# Altium footprint library THU VIEN PCB.PCBLib: 911 footprints (part 56 of 57)
Each footprint in its own frame and in the unit in brackets; x right, y up, seen from the top. Pads: shape width x height; smd on the part's side, far side on the other; paste and mask are expansions set on the pad; w line width, h text height; cw(c..) or ccw(c..) is an arc to the next point about the centre after c.
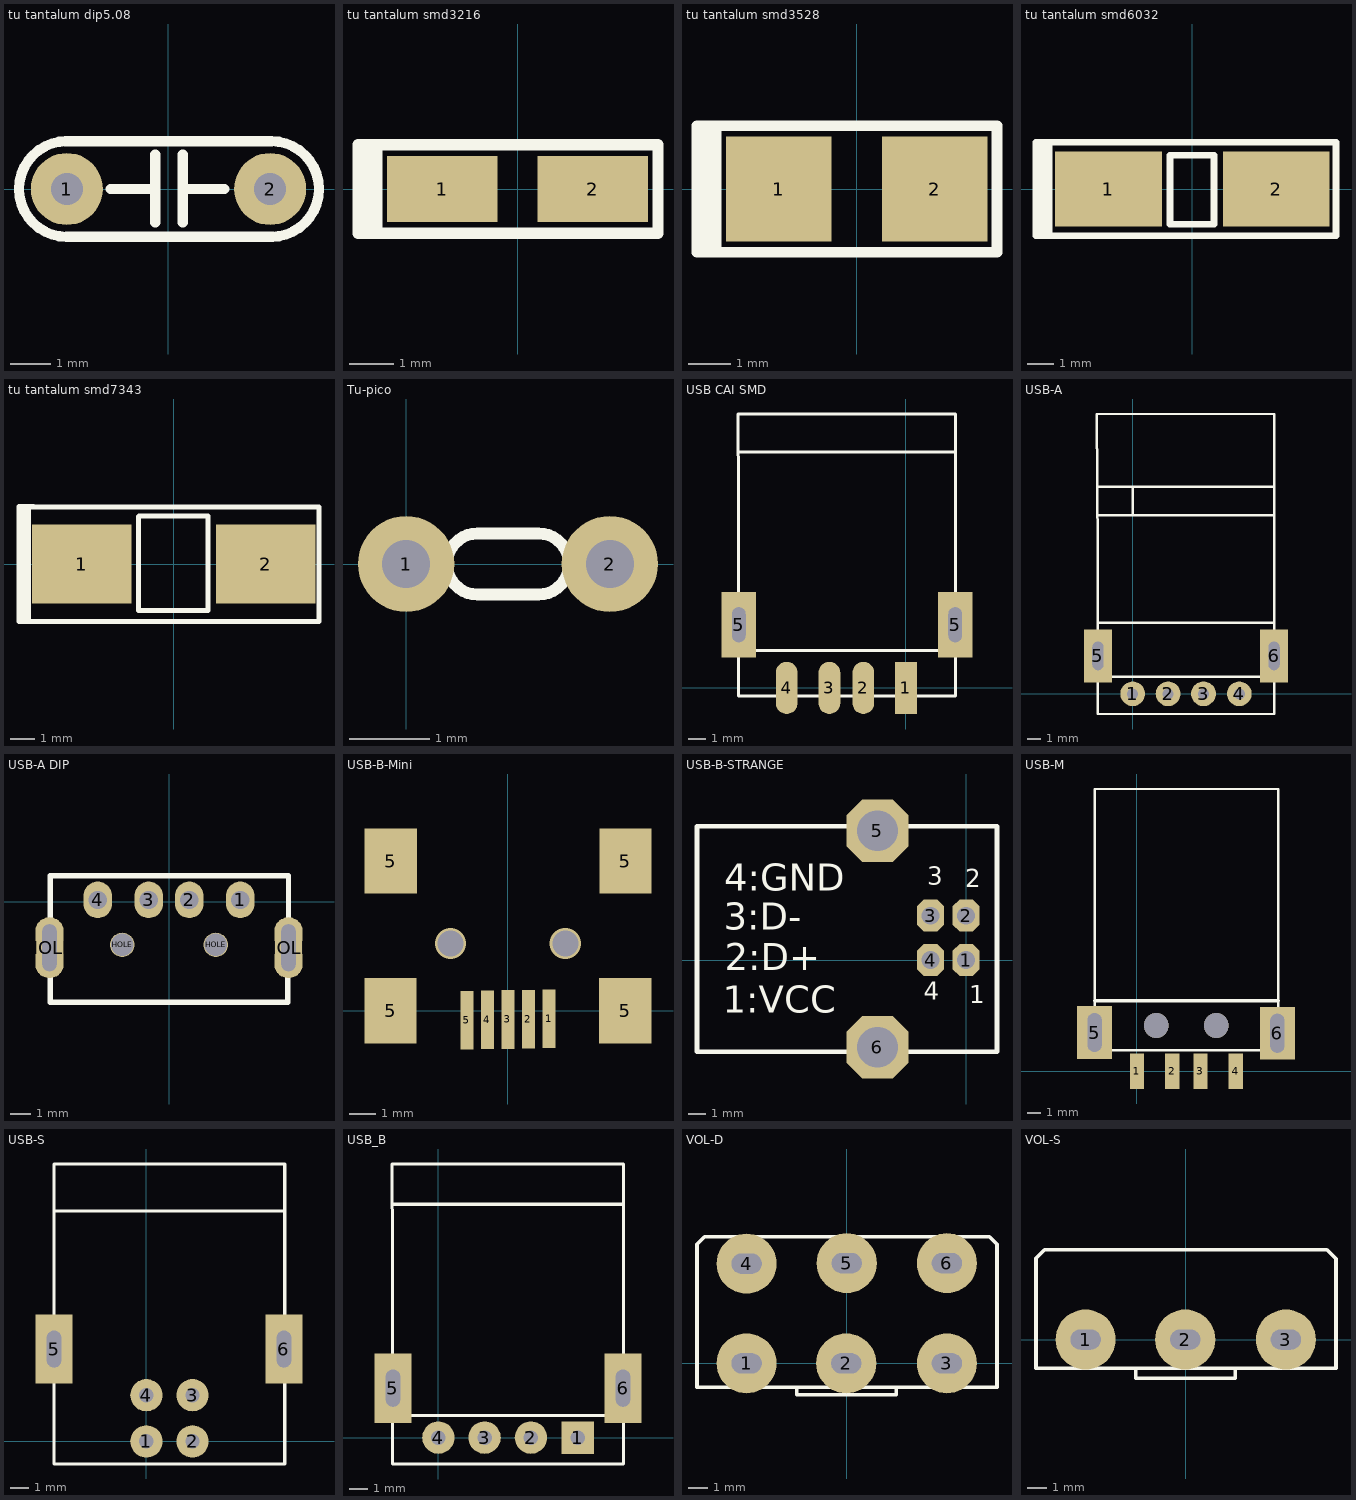
[diagram p55: the footprints below, top view; thin cyan lines are the x and y axes]

## tu tantalum dip5.08 [mm]
pads (2):
  round 1.8 hole 0.8: 1(-2.54,0) 2(2.54,0)
Top Overlay:
  lines w0.254: -2.565,1.194 2.565,1.194 ; -2.541,-1.195 cw(c-2.54,0) -2.541,1.195 ; -2.489,-1.194 2.591,-1.194 ; -1.448,0 -0.406,0 ; -0.33,-0.838 -0.33,0.864 ; 0.356,-0.838 0.356,0.864 ; 0.356,0 1.397,0 ; 2.566,-1.195 ccw(c2.565,0) 2.566,1.195
3D body "TU_TATA_5.08.step": height 6.27, standoff -0.47, extent -2.819,-1.079 2.769,1.08

## tu tantalum smd3216 [mm]
pads (2):
  rect 2.5x1.5 smd: 1(-1.7,0) 2(1.7,0)
Top Overlay:
  lines w0.254: -3.607,-1 -3.607,1 ; -3.556,-1 3.175,-1 3.175,1 -3.556,1 ; -3.378,-1 -3.378,1 ; -3.175,-1 -3.175,1
3D body "CAP_TANT_3216-18.step": height 1.69, standoff -0.01, extent -1.7,-0.9 1.7,0.9

## tu tantalum smd3528 [mm]
pads (2):
  rect 2.5x2.5 smd: 1(-1.85,0) 2(1.85,0)
Top Overlay:
  lines w0.254: -3.785,-1.5 -3.785,1.5 ; -3.785,-1.499 -3.2,-1.499 ; -3.785,1.499 -3.251,1.499 ; -3.556,-1.5 -3.556,1.5 ; -3.327,-1.5 -3.327,1.5 3.327,1.5 3.327,-1.5 -3.327,-1.5
3D body "CAP_TANT_3528.step": height 2.03, standoff 0, extent -1.85,-1.465 1.85,1.465

## tu tantalum smd6032 [mm]
pads (2):
  rect 4x2.8 smd: 1(-3.15,0) 2(3.15,0)
Top Overlay:
  lines w0.254: -5.867,-1.753 -5.486,-1.753 ; -5.867,-1.75 -5.867,1.75 ; -5.867,1.753 -5.563,1.753 ; -5.613,-1.75 -5.613,1.75 ; -5.563,-1.75 5.385,-1.75 5.385,1.75 -5.563,1.75 ; -5.385,-1.75 -5.385,1.75 ; -0.838,-1.321 0.813,-1.321 0.813,1.27 -0.838,1.27 -0.838,-1.321
3D body "CAP_TANT_6032-28_y.step": height 2.79, standoff -0.01, extent -3.15,-1.75 3.15,1.75

## tu tantalum smd7343 [mm]
pads (2):
  rect 4x3.2 smd: 1(-3.7,0) 2(3.7,0)
Top Overlay:
  lines w0.2: -6.231,2.3 -6.231,-2.311 -5.85,-2.311 ; -6.223,2.311 -5.639,2.311 ; -1.422,1.905 -1.422,-1.88 1.372,-1.88 1.372,1.93 -1.397,1.93 ; -5.85,-2.311 -5.85,2.3 5.85,2.3 5.85,-2.311 -5.85,-2.311
  lines w0.25: -6.053,-2.3 -6.053,2.3
3D body "CAP_TANT_7343-40.step": height 3.99, standoff -0.01, extent -3.749,-2.325 3.851,2.275

## Tu-pico [mm] "Tu gom mini"
pads (2):
  round 1.2 hole 0.6: 1(0,0) 2(2.54,0)
Top Overlay:
  lines w0.15: 0.889,-0.381 cw(c0.889,0) 0.889,0.381 1.651,0.381 cw(c1.651,0) 1.651,-0.381 0.889,-0.381
3D body "User Library-Cap 100n.step": height 6.12, standoff -1.8, extent -1.647,-0.848 4.191,0.848

## USB CAI SMD [mil]
pads (6):
  rect 50x120 smd: 1(0,0)
  oval 50x120 smd: 2(-98,0) 3(-176,0) 4(-274,0)
  rect 80x150 hole 31 slot 80 at 90 deg: 5(-384,145) 5(113,145)
Top Overlay:
  lines w7: -385,542 114,542 ; -384,86 115,86 ; -386,629 114,629 114,-19 -385,-19 -385,435 -386,629
3D body "usb_a-usb_a_smt.stp": height 296.33, standoff -149.13, extent -446,-40.23 172.11,556.23

## USB-A [mil]
pads (6):
  round 70 hole 31: 1(0,0) 2(100,0) 3(200,0) 4(301,0)
  rect 80x150 hole 31 slot 80 at 90 deg: 5(-98,107) 6(399,107)
Top Overlay:
  lines w7: -99,200 400,200 ; -99,504 400,504 ; -99,584 400,584 ; -98,48 401,48 ; 0,504 0,584 ; -101.03,790 400,790 400,-57 -99,-57 -99,397 -101.03,790
3D body "usb_a-usb_a-lp-c.stp": height 177.17, standoff -51.16, extent -97.29,-0.22 399,784.22

## USB-A DIP [mm] "USB Type A"
pads (8):
  oval 1.4x1.8 hole 0.9: 1(3.5,0.08) 2(1,0.08) 3(-1,0.08) 4(-3.5,0.08)
  oval 1.4x3 hole 0.7 slot 2.3 at 90 deg: HOLE(-5.875,-2.27) HOLE(5.875,-2.27)
  round 1.2 hole 1.1: HOLE(-2.3,-2.13) HOLE(2.3,-2.13)
Top Overlay:
  lines w0.254: 5.842,-2.27 5.842,-4.953 -5.842,-4.953 -5.842,1.27 5.875,1.27 5.875,-2.27
Keep-Out Layer:
  lines w0.254: 5.842,-2.27 5.875,-2.27
3D body "Samtec-USB-AM-S-F-B-TH-FlashDrive.step": height 2.18, standoff -3.52, extent -6.25,-19.8 6.25,0.23

## USB-B-Mini [mm]
pads (9):
  rect 0.5x2.25 smd: 1(1.575,-0.305) 2(0.787,-0.318) 3(0,-0.33) 4(-0.787,-0.343) 5(-1.575,-0.356)
  rect 2x2.5 smd: 5(-4.5,0) 5(-4.496,5.74) 5(4.5,0) 5(4.504,5.74)
via 2.2,2.58 diameter 1.2 hole 1
via -2.2,2.58 diameter 1.2 hole 1
3D body "User Library-USB_mini_B.step": height 3.95, standoff -1, extent -5.35,-0.673 5.35,8.527

## USB-B-STRANGE [mm] "USB Type B - STRANGE - Slave Device"
pads (6):
  oct 1.5x1.8 hole 1: 1(0,0) 2(0,2.5) 3(-2,2.5) 4(-2,0)
  oct 3.5x3.5 hole 2.3: 5(-4.988,7.283) 6(-4.988,-4.909)
Top Overlay:
  lines w0.254: -15.148,-5.163 -15.148,7.537 1.743,7.537 1.743,-5.163 -15.148,-5.163
  text "1:VCC" at -13.701,-2.978 h1.52
  text "2:D+" at -13.574,-0.565 h1.52
  text "3:D-" at -13.65,1.695 h1.52
  text "4:GND" at -13.624,3.905 h1.52
  text "1" at 0.193,-2.42 h1
  text "3" at -2.194,4.235 h1
  text "2" at -0.035,4.108 h1
  text "4" at -2.372,-2.242 h1
3D body "Samtec-USB-B-S-F-B-TH-Strange.step": height 10.98, standoff -3.24, extent -15.45,-6.179 0.85,8.68

## USB-M [mil] "For USB SMD"
height 150
pads (6):
  rect 40x100 smd: 1(0,0) 2(100,0) 3(180,0) 4(280,0)
  rect 100x150 hole 40 slot 110 at 90 deg: 5(-120,110) 6(398,108)
via 55,130 diameter 70 hole 70
via 225,130 diameter 70 hole 70
Top Overlay:
  lines w7: -120,60 400,60 400,800 -120,800 -120,60
  lines w10: -120,200 400,200

## USB-S [mil] "USB B connector, 4pin, For Print"
height 100
pads (6):
  round 70 hole 31: 1(0,0) 2(100,0) 3(100,100) 4(0,100)
  rect 80x150 hole 31 slot 80 at 90 deg: 5(-200,200) 6(298,200)
Top Overlay:
  lines w7: -200,499 300,499 ; -200,-49 -200,601 300,601 300,-49 -200,-49
3D body "usb_a-usbsb.stp": height 421.26, standoff -155.51, extent -243.31,-39.61 343.31,610

## USB_B [mil] "USB A connector, 4pin, For USB sing"
height 100
pads (6):
  rect 70x70 hole 31: 1(301,0)
  round 70 hole 31: 2(200,0) 3(100,0) 4(0,0)
  rect 80x150 hole 31 slot 80 at 90 deg: 5(-98,107) 6(399,107)
Top Overlay:
  lines w7: -99,504 400,504 ; -98,48 401,48 ; -100,591 -99,397 -99,-57 400,-57 400,591 -100,591
3D body "usb_a-usbsa.stp": height 277.51, standoff -149.84, extent -162.02,-58 460.02,512.87

## VOL-D [mil] "Volume control Dual"
height 400
pads (6):
  round 120 hole 40 slot 60 at 0 deg: 1(-200,0) 2(-1,0) 3(200,0) 4(-200,199) 5(0,200) 6(200,200)
Top Overlay:
  lines w7: -100,-48 -100,-63 99,-63 99,-48 ; -299,-48 300,-48 300,238 285,253 -284,253 -299,238 -299,-48
3D body "SW3dPS-ALPHA-potentiometer stereo PCB mount.STEP": height 834.65, standoff -129.92, extent -338.65,-1309.27 330.65,299

## VOL-S [mil] "Volume control single"
height 400
pads (3):
  round 120 hole 40 slot 60 at 0 deg: 1(-200,0) 2(-1,0) 3(200,0)
Top Overlay:
  lines w7: -100,-57 -100,-77 99,-77 99,-57 ; -299,-57 300,-57 300,161 282,179 -282,179 -299,162 -299,-57